# Altium footprint library My Library.PcbLib: 872 footprints (part 50 of 55)
Each footprint in its own frame and in the unit in brackets; x right, y up, seen from the top. Pads: shape width x height; smd on the part's side, far side on the other; paste and mask are expansions set on the pad; w line width, h text height; cw(c..) or ccw(c..) is an arc to the next point about the centre after c.
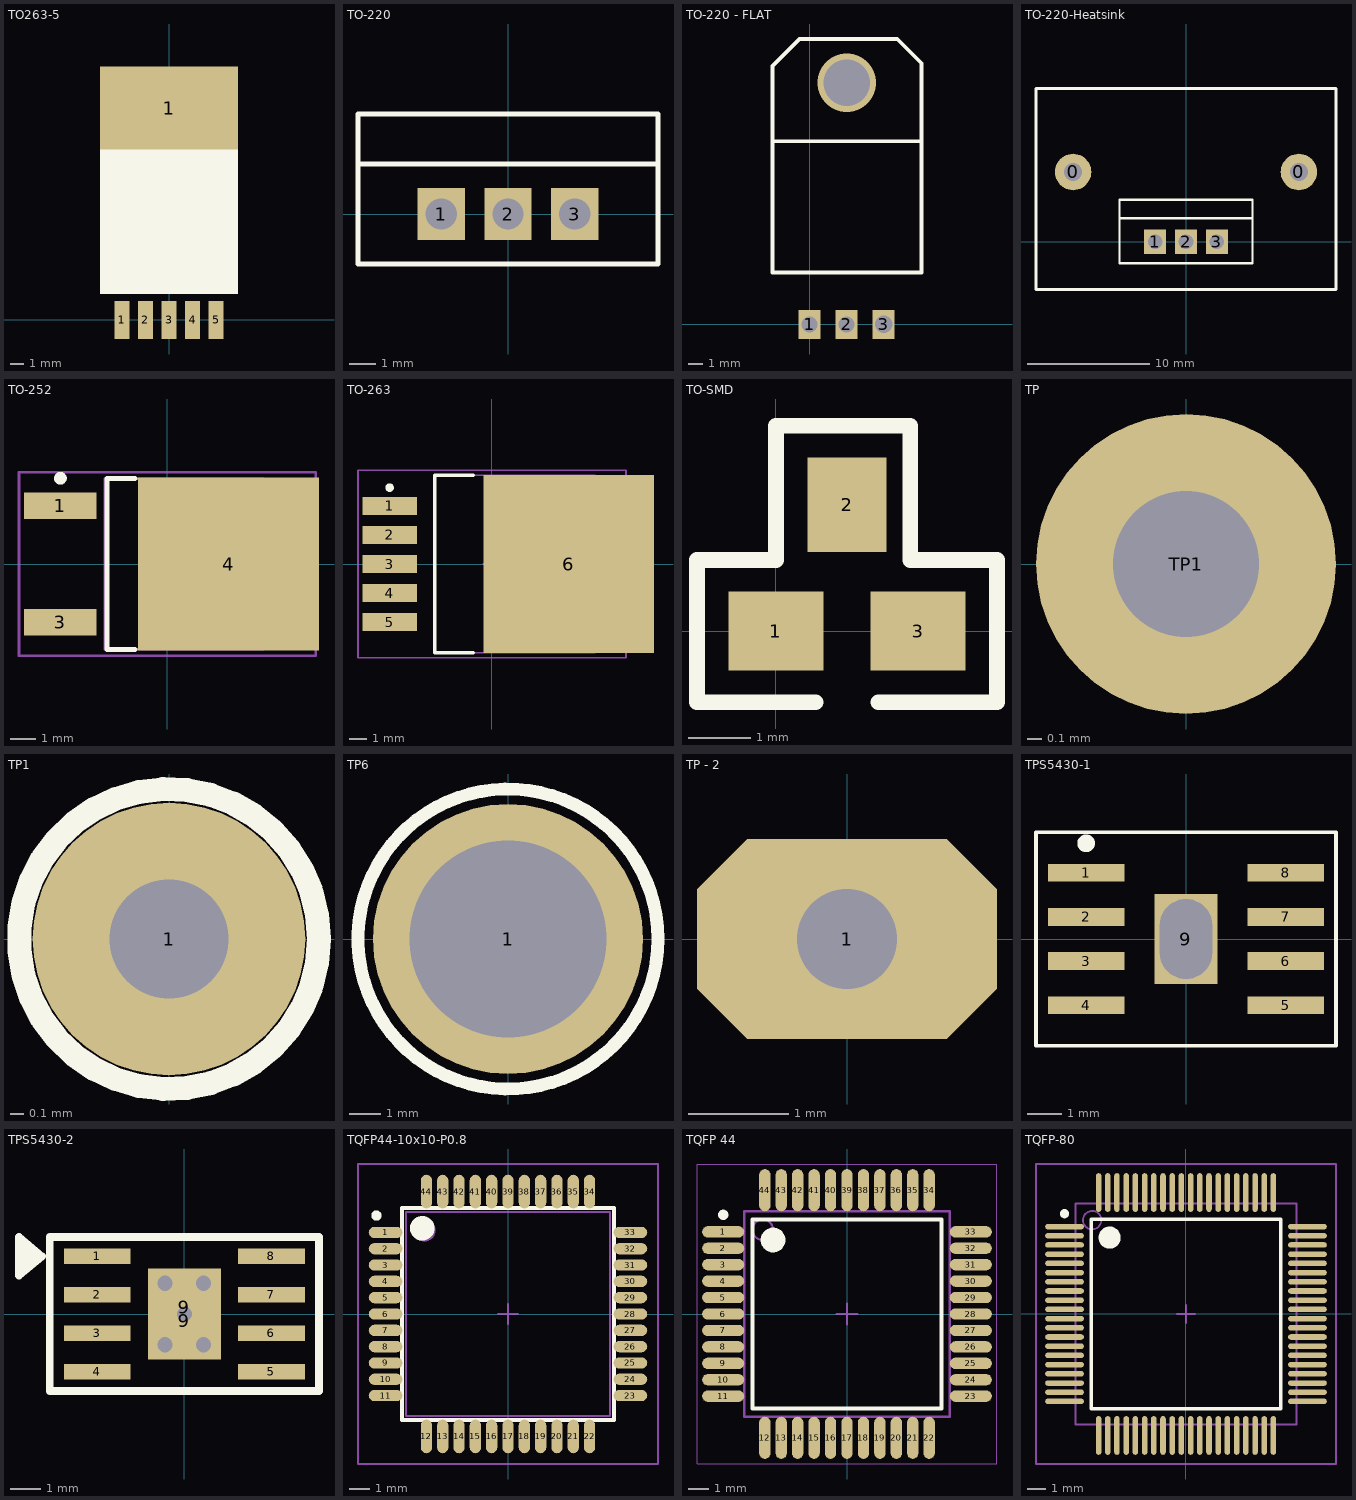
[diagram p49: the footprints below, top view; thin cyan lines are the x and y axes]

## TO263-5 [mm] "LM2576-SMD"
pads (6):
  rect 1.07x2.75 smd: 1(-3.4,-0.025) 2(-1.7,-0.025) 3(0,-0.025) 4(1.7,-0.025) 5(3.4,-0.025)
  rect 10x6 smd: 1(0,15.289)
Top Overlay:
  rectangle: -5,1.854 5,12.878
3D body "SW3dPS-TO263-5.STEP": height 4.79, standoff -0.01, extent -5,-0.381 5,15.289

## TO-220 [mm]
pads (3):
  rect 1.8x2 hole 1.2: 1(-2.54,0) 2(0,0) 3(2.54,0)
Top Overlay:
  lines w0.2: -5.715,1.905 5.715,1.905 ; -5.715,-1.905 -5.715,2.54 -5.715,3.81 5.715,3.81 5.715,-1.905 -5.715,-1.905
3D body "User Library-TO-220-3.step": height 8.08, standoff -20.7, extent -4.925,-2.134 4.975,2.366

## TO-220 - FLAT [mm]
pads (3):
  rect 1.5x2 hole 1.1: 1(0,0) 2(2.54,0)
  rect 1.5x2 hole 1.2: 3(5.08,0)
via 2.54,16.562 diameter 4 hole 3.2
Top Overlay:
  lines w0.254: -2.54,5.861 -2.54,17.71 -0.686,19.564 6.007,19.564 7.671,17.901 7.671,3.562 -2.54,3.562 -2.54,12.554 7.671,12.554
3D body "TO220_NAM.step": height 4.45, standoff -1.79, extent -2.54,-0.19 7.62,19.09

## TO-220-Heatsink [mm] "TO, Thru-Hole, Vertical, Heatsink Mounted; 15 Bent Staggered Leads; Pitch 1.27 mm"
height 21
pads (5):
  round 3 hole 1.5: 0(-9.271,5.715) 0(9.271,5.715)
  rect 1.8x2 hole 1.2: 1(-2.54,0) 2(0,0) 3(2.54,0)
Top Overlay:
  lines w0.2: -5.461,1.905 5.461,1.905 ; -5.461,-1.778 5.461,-1.778 5.461,3.429 -5.461,3.429 -5.461,-1.778
  lines w0.254: -12.319,-3.937 12.319,-3.937 12.319,12.573 -12.319,12.573 -12.319,-3.937
3D body "User Library-radiator_l298.STEP": height 25.01, standoff -3.99, extent -12,-3.681 12,12.319
3D body "BTB16-600CWRG.stp": height 22.62, standoff -8.37, extent -5.335,-1.562 5.335,3.268

## TO-252 [mm] "KVU D-PAK, 3-Pads, Body 6,2x6,7mm (max), IPC Medium Density"
height 2.4
pads (3):
  rect 2.85x1.05 smd: 1(-4.2,2.29) 3(-4.2,-2.29)
  rect 7.1x6.8 smd: 4(2.4,0)
Top Overlay:
  circle w0.25: c-4.2,3.365 r0.125
  lines w0.2: -1.27,-3.35 -2.375,-3.35 -2.375,3.35 -1.27,3.35
Mechanical 13:
  lines w0.1: -2.45,-3.35 -2.45,3.35 3.77,3.35 3.77,-3.35 -2.45,-3.35
Mechanical 15:
  lines w0.1: -0.5,0 0.5,0 ; 0,-0.5 0,0.5 ; -5.825,-3.6 -5.825,3.6 5.825,3.6 5.825,-3.6 -5.825,-3.6
3D body: height 2.4, standoff 0.1, extent -2.45,-3.35 3.77,3.35
3D body: height 0.35, standoff 0.1, extent -5.025,1.782 -3.374,2.798
3D body: height 1.35, standoff 1.1, extent -3.683,1.778 -2.375,2.794
3D body: height 1.35, standoff 0, extent -3.683,1.778 -3.374,2.798
3D body: height 1.35, standoff 0, extent -3.683,-2.794 -3.374,-1.774
3D body: height 1.35, standoff 1.1, extent -3.683,-2.794 -2.375,-1.778
3D body: height 0.35, standoff 0.1, extent -5.025,-2.79 -3.374,-1.774
3D body: height 0.75, standoff 0.1, extent 3.77,-2.921 5.08,2.921
3D body: height 1.35, standoff 1.1, extent -3.104,-0.508 -1.796,0.508

## TO-263 [mm]
pads (6):
  rect 3.2x1.05 smd: 1(-6,3.4) 2(-6,1.7) 3(-6,0) 4(-6,-1.7) 5(-6,-3.4)
  rect 10x10.45 smd: 6(4.5,0)
Top Overlay:
  circle w0.25: c-6,4.475 r0.125
  lines w0.2: -1.1,-5.2 -3.35,-5.2 -3.35,5.2 -1.1,5.2
Mechanical 13:
  lines w0.1: -3.35,-5.2 -3.35,5.2 6.05,5.2 6.05,-5.2 -3.35,-5.2
Mechanical 15:
  lines w0.1: -0.5,0 0.5,0 ; 0,-0.5 0,0.5 ; -7.85,-5.5 -7.85,5.5 7.85,5.5 7.85,-5.5 -7.85,-5.5
3D body: height 0.5, standoff 0, extent 6.05,-5.2 7.569,5.2
3D body: height 0.5, standoff 0, extent -6.566,-3.95 -4.305,-2.857
3D body: height 2, standoff 0, extent -4.953,-3.95 -4.293,-2.857
3D body: height 2, standoff 1.5, extent -4.953,-3.937 -3.251,-2.845
3D body: height 0.5, standoff 0, extent -6.54,-0.597 -4.28,0.495
3D body: height 2, standoff 0, extent -4.928,-0.597 -4.267,0.495
3D body: height 2, standoff 1.5, extent -4.928,-0.584 -3.226,0.508
3D body: height 2, standoff 1.5, extent -4.94,-2.273 -3.238,-1.181
3D body: height 2, standoff 0, extent -4.94,-2.286 -4.28,-1.194
3D body: height 0.5, standoff 0, extent -6.553,-2.286 -4.293,-1.194
3D body: height 0.5, standoff 0, extent -6.579,1.143 -4.318,2.235
3D body: height 2, standoff 0, extent -4.966,1.143 -4.305,2.235
3D body: height 2, standoff 1.5, extent -4.966,1.156 -3.264,2.248
3D body: height 2, standoff 1.5, extent -4.953,2.845 -3.251,3.937
3D body: height 2, standoff 0, extent -4.953,2.832 -4.293,3.924
3D body: height 0.5, standoff 0, extent -6.566,2.832 -4.305,3.924
3D body: height 4.65, standoff 0, extent -3.35,-5.2 6.05,5.2

## TO-SMD [mil]
pads (3):
  rect 60x50 smd: 1(0,0) 3(90,0)
  rect 50x60 smd: 2(45,80)
Top Overlay:
  lines w10: 25,-45 -50,-45 -50,45 0,45 0,115 0,130 85,130 85,115 85,45 140,45 140,-45 65,-45

## TP [mil] "Connect 1"
pads (1):
  round 80 hole 39: TP1(0,0)
3D body "socket 1-1.stp": height 178.54, standoff -113.98, extent -50,-50 50,50

## TP1 [mil] "Test point"
height 150
pads (1):
  round 80 hole 35: 1(0,0)
Top Overlay:
  circle w7: c0,0 r44.01
3D body "socket 1-1.stp": height 178.11, standoff -114.41, extent -50,-50 50,50

## TP6 [mm] "Jac cap 6ly"
height 3.81
pads (1):
  round 8.5 hole 6.2: 1(0,0)
Top Overlay:
  circle w0.406: c0,0 r4.724

## TP - 2 [mm] "TestPoint"
pads (1):
  oct 3x2 hole 1: 1(0,0)

## TPS5430-1 [mm]
pads (9):
  rect 2.2x0.508 smd: 1(-2.875,1.905) 2(-2.875,0.635) 3(-2.875,-0.635) 4(-2.875,-1.905) 5(2.875,-1.905) 6(2.875,-0.635) 7(2.875,0.635) 8(2.875,1.905)
  rect 1.8x2.6 hole 1.5 slot 2.3 at 90 deg: 9(0,0)
Top Overlay:
  circle w0.254: c-2.875,2.755 r0.127
  lines w0.102: -4.318,-3.069 -4.318,3.069 4.318,3.069 4.318,-3.069 -4.318,-3.069
3D body: height 1.69, standoff 0, extent -1.544,1.041 -0.546,2.039
3D body: height 1.68, standoff 0.25, extent -1.995,-2.49 1.995,2.49
3D body: height 0.89, standoff 0.79, extent -2.286,1.676 -1.778,2.134
3D body: height 0.89, standoff 0, extent -2.388,1.676 -2.286,2.134
3D body: height 0.1, standoff 0, extent -3.327,1.676 -2.388,2.134
3D body: height 0.1, standoff 0, extent -3.327,0.406 -2.388,0.864
3D body: height 0.89, standoff 0, extent -2.388,0.406 -2.286,0.864
3D body: height 0.89, standoff 0.79, extent -2.286,0.406 -1.778,0.864
3D body: height 0.1, standoff 0, extent -3.327,-0.864 -2.388,-0.406
3D body: height 0.89, standoff 0, extent -2.388,-0.864 -2.286,-0.406
3D body: height 0.89, standoff 0.79, extent -2.286,-0.864 -1.778,-0.406
3D body: height 0.1, standoff 0, extent -3.327,-2.134 -2.388,-1.676
3D body: height 0.89, standoff 0, extent -2.388,-2.134 -2.286,-1.676
3D body: height 0.89, standoff 0.79, extent -2.286,-2.134 -1.778,-1.676
3D body: height 0.89, standoff 0.79, extent 1.778,1.676 2.286,2.134
3D body: height 0.89, standoff 0, extent 2.286,1.676 2.388,2.134
3D body: height 0.1, standoff 0, extent 2.388,1.676 3.327,2.134
3D body: height 0.89, standoff 0.79, extent 1.778,0.406 2.286,0.864
3D body: height 0.89, standoff 0, extent 2.286,0.406 2.388,0.864
3D body: height 0.1, standoff 0, extent 2.388,0.406 3.327,0.864
3D body: height 0.89, standoff 0.79, extent 1.778,-0.864 2.286,-0.406
3D body: height 0.89, standoff 0, extent 2.286,-0.864 2.388,-0.406
3D body: height 0.1, standoff 0, extent 2.388,-0.864 3.327,-0.406
3D body: height 0.1, standoff 0, extent 2.388,-2.134 3.327,-1.676
3D body: height 0.89, standoff 0, extent 2.286,-2.134 2.388,-1.676
3D body: height 0.89, standoff 0.79, extent 1.778,-2.134 2.286,-1.676

## TPS5430-2 [mm]
pads (10):
  rect 2.2x0.508 smd: 1(-2.875,1.905) 2(-2.875,0.635) 3(-2.875,-0.635) 4(-2.875,-1.905) 5(2.875,-1.905) 6(2.875,-0.635) 7(2.875,0.635) 8(2.875,1.905)
  rect 2.413x2.54 smd: 9(0,-0.229) 9(0,0.229)
via -0.635,1.016 diameter 0.9 hole 0.5
via 0.635,-1.016 diameter 0.9 hole 0.5
via 0.635,1.016 diameter 0.9 hole 0.5
via -0.635,-1.016 diameter 0.9 hole 0.5
via 0,0 diameter 0.9 hole 0.5
Top Overlay:
  region: -4.699,1.905 -5.461,2.54 -5.461,1.27
  lines w0.254: -5.461,1.27 -4.699,1.905 -5.461,2.54 -5.461,1.27 ; -4.445,-2.54 -4.445,2.54 4.445,2.54 4.445,-2.54 -4.445,-2.54
3D body: height 1.69, standoff 0, extent -1.554,1.031 -0.536,2.049
3D body: height 1.68, standoff 0.25, extent -1.995,-2.49 1.995,2.49
3D body: height 0.89, standoff 0.79, extent -2.286,1.676 -1.778,2.134
3D body: height 0.89, standoff 0, extent -2.388,1.676 -2.286,2.134
3D body: height 0.1, standoff 0, extent -3.327,1.676 -2.388,2.134
3D body: height 0.1, standoff 0, extent -3.327,0.406 -2.388,0.864
3D body: height 0.89, standoff 0, extent -2.388,0.406 -2.286,0.864
3D body: height 0.89, standoff 0.79, extent -2.286,0.406 -1.778,0.864
3D body: height 0.1, standoff 0, extent -3.327,-0.864 -2.388,-0.406
3D body: height 0.89, standoff 0, extent -2.388,-0.864 -2.286,-0.406
3D body: height 0.89, standoff 0.79, extent -2.286,-0.864 -1.778,-0.406
3D body: height 0.1, standoff 0, extent -3.327,-2.134 -2.388,-1.676
3D body: height 0.89, standoff 0, extent -2.388,-2.134 -2.286,-1.676
3D body: height 0.89, standoff 0.79, extent -2.286,-2.134 -1.778,-1.676
3D body: height 0.89, standoff 0.79, extent 1.778,1.676 2.286,2.134
3D body: height 0.89, standoff 0, extent 2.286,1.676 2.388,2.134
3D body: height 0.1, standoff 0, extent 2.388,1.676 3.327,2.134
3D body: height 0.89, standoff 0.79, extent 1.778,0.406 2.286,0.864
3D body: height 0.89, standoff 0, extent 2.286,0.406 2.388,0.864
3D body: height 0.1, standoff 0, extent 2.388,0.406 3.327,0.864
3D body: height 0.89, standoff 0.79, extent 1.778,-0.864 2.286,-0.406
3D body: height 0.89, standoff 0, extent 2.286,-0.864 2.388,-0.406
3D body: height 0.1, standoff 0, extent 2.388,-0.864 3.327,-0.406
3D body: height 0.1, standoff 0, extent 2.388,-2.134 3.327,-1.676
3D body: height 0.89, standoff 0, extent 2.286,-2.134 2.388,-1.676
3D body: height 0.89, standoff 0.79, extent 1.778,-2.134 2.286,-1.676

## TQFP44-10x10-P0.8 [mm] "QFP, 44-Leads, Body 10x10mm, Pitch 0.8mm, IPC High Density"
height 2.44
pads (44):
  oval 1.65x0.55 smd: 1(-6,4) 2(-6,3.2) 3(-6,2.4) 4(-6,1.6) 5(-6,0.8) 6(-6,0) 7(-6,-0.8) 8(-6,-1.6) 9(-6,-2.4) 10(-6,-3.2) 11(-6,-4) 23(6,-4) 24(6,-3.2) 25(6,-2.4) 26(6,-1.6) 27(6,-0.8) 28(6,0) 29(6,0.8) 30(6,1.6) 31(6,2.4) 32(6,3.2) 33(6,4)
  oval 0.55x1.65 smd: 12(-4,-6) 13(-3.2,-6) 14(-2.4,-6) 15(-1.6,-6) 16(-0.8,-6) 17(0,-6) 18(0.8,-6) 19(1.6,-6) 20(2.4,-6) 21(3.2,-6) 22(4,-6) 34(4,6) 35(3.2,6) 36(2.4,6) 37(1.6,6) 38(0.8,6) 39(0,6) 40(-0.8,6) 41(-1.6,6) 42(-2.4,6) 43(-3.2,6) 44(-4,6)
Top Overlay:
  circle w0.25: c-6.45,4.825 r0.125
  circle w0.6: c-4.2,4.2 r0.3
  lines w0.2: -5.2,-5.2 -5.2,5.2 5.2,5.2 5.2,-5.2 -5.2,-5.2
Mechanical 13:
  circle w0.1: c-4.1,4.1 r0.5
  lines w0.1: -5,-5 -5,5 5,5 5,-5 -5,-5
Mechanical 15:
  lines w0.1: -0.5,0 0.5,0 ; 0,-0.5 0,0.5 ; -7.35,-7.35 -7.35,7.35 7.35,7.35 7.35,-7.35 -7.35,-7.35
3D body "User Library-TQFP44.step": height 1.07, standoff 0, extent -5.994,-5.994 6.006,6.006

## TQFP 44 [mm] "TQFP, 44-Leads, Body 10,00x10,00mm, Pitch 0,80mm, IPC Medium Density"
height 1.2
pads (44):
  oval 2.05x0.55 smd: 1(-6.025,4) 2(-6.025,3.2) 3(-6.025,2.4) 4(-6.025,1.6) 5(-6.025,0.8) 6(-6.025,0) 7(-6.025,-0.8) 8(-6.025,-1.6) 9(-6.025,-2.4) 10(-6.025,-3.2) 11(-6.025,-4) 23(6.025,-4) 24(6.025,-3.2) 25(6.025,-2.4) 26(6.025,-1.6) 27(6.025,-0.8) 28(6.025,0) 29(6.025,0.8) 30(6.025,1.6) 31(6.025,2.4) 32(6.025,3.2) 33(6.025,4)
  oval 0.55x2.05 smd: 12(-4,-6.025) 13(-3.2,-6.025) 14(-2.4,-6.025) 15(-1.6,-6.025) 16(-0.8,-6.025) 17(0,-6.025) 18(0.8,-6.025) 19(1.6,-6.025) 20(2.4,-6.025) 21(3.2,-6.025) 22(4,-6.025) 34(4,6.025) 35(3.2,6.025) 36(2.4,6.025) 37(1.6,6.025) 38(0.8,6.025) 39(0,6.025) 40(-0.8,6.025) 41(-1.6,6.025) 42(-2.4,6.025) 43(-3.2,6.025) 44(-4,6.025)
Top Overlay:
  circle w0.25: c-6.025,4.825 r0.125
  circle w0.6: c-3.6,3.6 r0.3
  lines w0.2: -4.6,-4.6 -4.6,4.6 4.6,4.6 4.6,-4.6 -4.6,-4.6
Mechanical 13:
  circle w0.1: c-4.1,4.1 r0.5
  lines w0.1: -5,-5 -5,5 5,5 5,-5 -5,-5
Mechanical 15:
  lines w0.05: -7.3,-7.3 -7.3,7.3 7.3,7.3 7.3,-7.3 -7.3,-7.3
  lines w0.1: -0.5,0 0.5,0 ; 0,-0.5 0,0.5
3D body "TQFP44.step": height 1.2, standoff 0, extent -6,-6 6,6

## TQFP-80 [mm] "Thin QFP, 80-Leads, Body 12x12mm, Pitch 0.5mm, IPC Low Density"
height 1.2
pads (80):
  oval 2.1x0.3 smd: 1(-6.6,4.75) 2(-6.6,4.25) 3(-6.6,3.75) 4(-6.6,3.25) 5(-6.6,2.75) 6(-6.6,2.25) 7(-6.6,1.75) 8(-6.6,1.25) 9(-6.6,0.75) 10(-6.6,0.25) 11(-6.6,-0.25) 12(-6.6,-0.75) 13(-6.6,-1.25) 14(-6.6,-1.75) 15(-6.6,-2.25) 16(-6.6,-2.75) 17(-6.6,-3.25) 18(-6.6,-3.75) 19(-6.6,-4.25) 20(-6.6,-4.75) 41(6.6,-4.75) 42(6.6,-4.25) 43(6.6,-3.75) 44(6.6,-3.25) 45(6.6,-2.75) 46(6.6,-2.25) 47(6.6,-1.75) 48(6.6,-1.25) 49(6.6,-0.75) 50(6.6,-0.25) 51(6.6,0.25) 52(6.6,0.75) 53(6.6,1.25) 54(6.6,1.75) 55(6.6,2.25) 56(6.6,2.75) 57(6.6,3.25) 58(6.6,3.75) 59(6.6,4.25) 60(6.6,4.75)
  oval 0.3x2.1 smd: 21(-4.75,-6.6) 22(-4.25,-6.6) 23(-3.75,-6.6) 24(-3.25,-6.6) 25(-2.75,-6.6) 26(-2.25,-6.6) 27(-1.75,-6.6) 28(-1.25,-6.6) 29(-0.75,-6.6) 30(-0.25,-6.6) 31(0.25,-6.6) 32(0.75,-6.6) 33(1.25,-6.6) 34(1.75,-6.6) 35(2.25,-6.6) 36(2.75,-6.6) 37(3.25,-6.6) 38(3.75,-6.6) 39(4.25,-6.6) 40(4.75,-6.6) 61(4.75,6.6) 62(4.25,6.6) 63(3.75,6.6) 64(3.25,6.6) 65(2.75,6.6) 66(2.25,6.6) 67(1.75,6.6) 68(1.25,6.6) 69(0.75,6.6) 70(0.25,6.6) 71(-0.25,6.6) 72(-0.75,6.6) 73(-1.25,6.6) 74(-1.75,6.6) 75(-2.25,6.6) 76(-2.75,6.6) 77(-3.25,6.6) 78(-3.75,6.6) 79(-4.25,6.6) 80(-4.75,6.6)
Top Overlay:
  circle w0.25: c-6.6,5.45 r0.125
  circle w0.6: c-4.15,4.15 r0.3
  lines w0.2: -5.15,-5.15 -5.15,5.15 5.15,5.15 5.15,-5.15 -5.15,-5.15
Mechanical 13:
  circle w0.1: c-5.1,5.1 r0.5
  lines w0.1: -6,-6 -6,6 6,6 6,-6 -6,-6
Mechanical 15:
  lines w0.1: -0.5,0 0.5,0 ; 0,-0.5 0,0.5 ; -8.15,-8.15 -8.15,8.15 8.15,8.15 8.15,-8.15 -8.15,-8.15
3D body: height 1.2, standoff 0, extent -6,-6 6,6